# Altium footprint library SMPSProject.PcbLib: 143 footprints (part 9 of 9)
Each footprint in its own frame and in the unit in brackets; x right, y up, seen from the top. Pads: shape width x height; smd on the part's side, far side on the other; paste and mask are expansions set on the pad; w line width, h text height; cw(c..) or ccw(c..) is an arc to the next point about the centre after c.
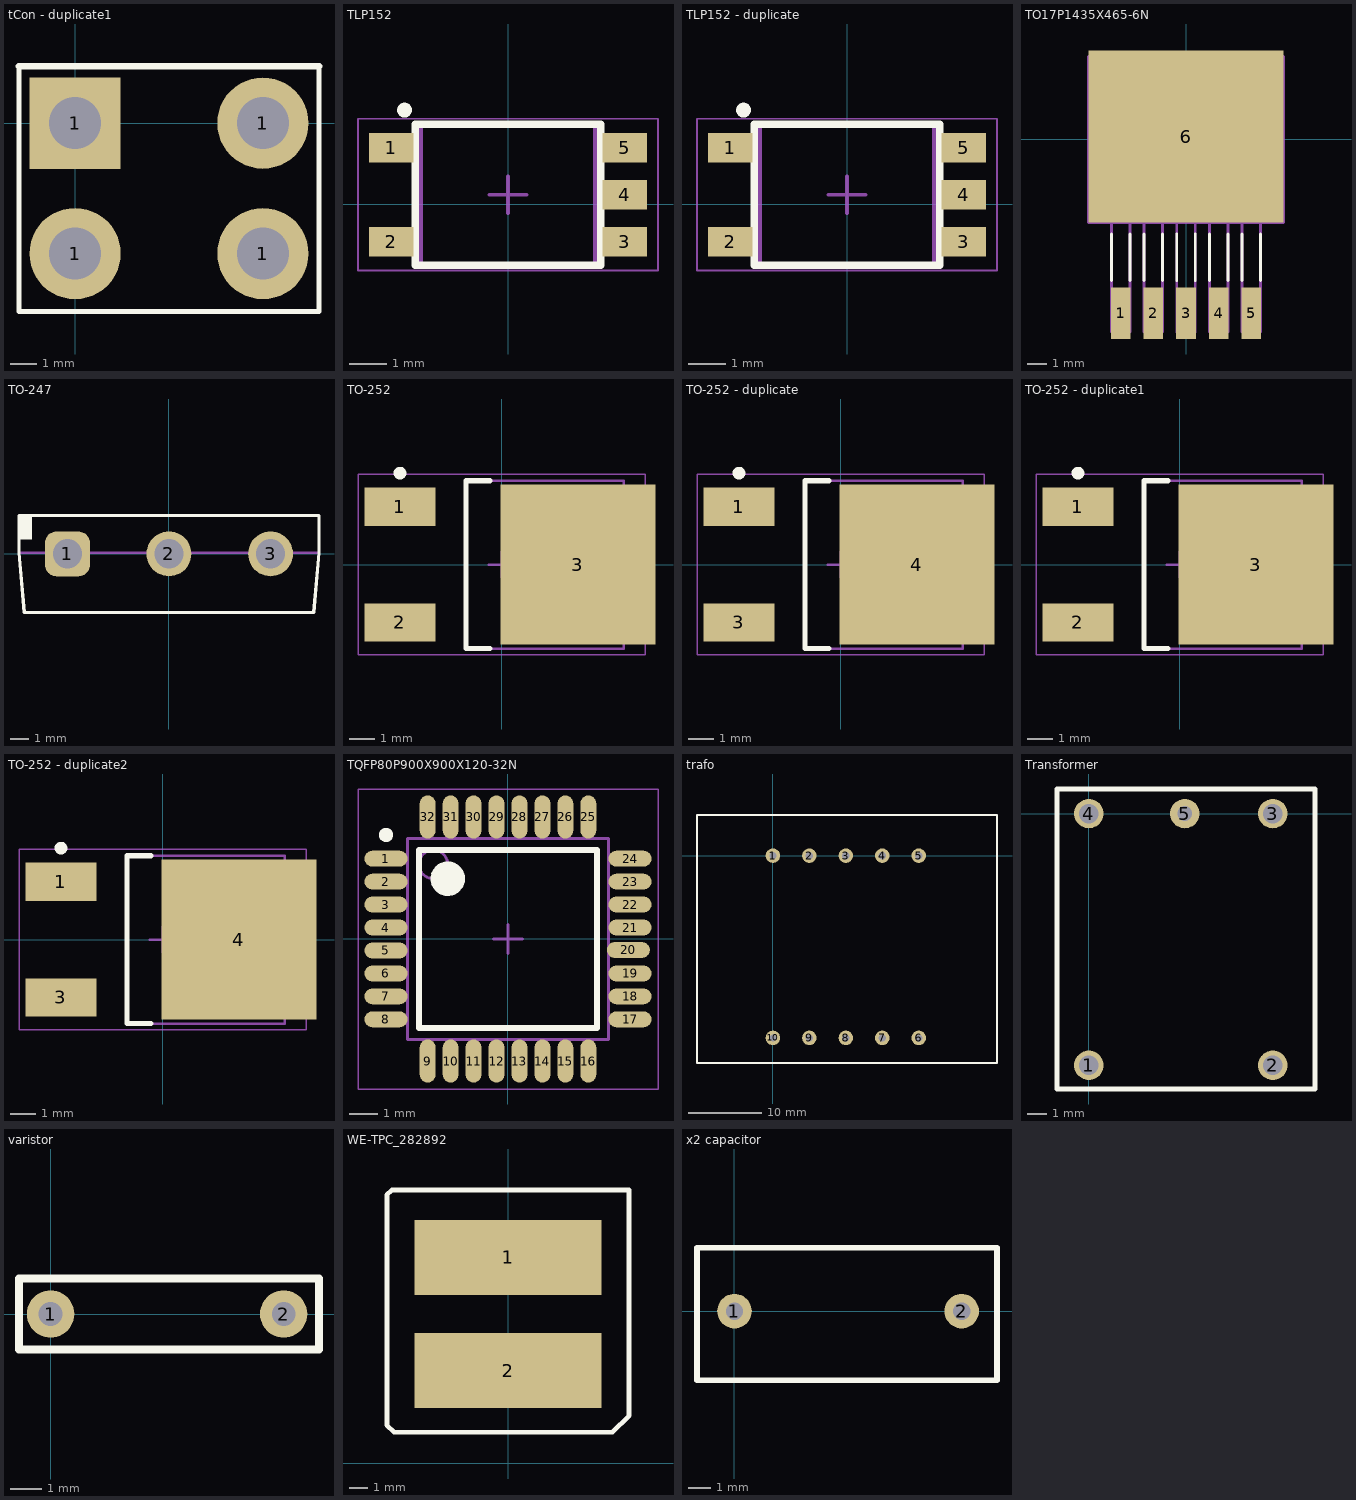
[diagram p8: the footprints below, top view; thin cyan lines are the x and y axes]

## tCon - duplicate1 [mm]
pads (4):
  round 3.5 hole 2: 1(0,-5) 1(7.2,-5) 1(7.2,0)
  rect 3.5x3.5 hole 2: 1(0,0)
Top Overlay:
  lines w0.2: -2.15,2.175 -2.15,-7.225 -0.05,-7.225 5.75,-7.225 7.925,-7.225 9.35,-7.225 9.35,2.175
  lines w0.254: -2.15,2.175 9.35,2.175

## TLP152 [mm] "SOTFL, 5-Leads, Body 3.75x7.20mm, Pitch 1.27mm, IPC Medium Density"
height 2.2
pads (5):
  rect 1.2x0.8 smd: 1(-3.15,1.524) 2(-3.15,-1.016) 3(3.15,-1.016) 4(3.15,0.254) 5(3.15,1.524)
Top Overlay:
  lines w0.2: -2.5,-1.646 -2.5,2.154 2.5,2.154 2.5,-1.646 -2.5,-1.646
  lines w0.25: -2.72,2.538 cw(c-2.794,2.54) -2.72,2.547
Top Courtyard:
  lines w0.05: -4.05,-1.796 4.05,-1.796 4.05,2.304 -4.05,2.304 -4.05,-1.796
  lines w0.1: -0.5,0.254 0.5,0.254 ; 0,-0.246 0,0.754
Top Assembly:
  lines w0.1: -2.35,-1.646 2.35,-1.646 2.35,2.154 -2.35,2.154 -2.35,-1.646
3D body "User Library-TLP-152-1.STEP": height 2.11, standoff 0.01, extent -3.393,-1.651 3.383,2.149

## TLP152 - duplicate [mm] "SOTFL, 5-Leads, Body 3.75x7.20mm, Pitch 1.27mm, IPC Medium Density"
height 2.2
pads (5):
  rect 1.2x0.8 smd: 1(-3.15,1.524) 2(-3.15,-1.016) 3(3.15,-1.016) 4(3.15,0.254) 5(3.15,1.524)
Top Overlay:
  lines w0.2: -2.5,-1.646 -2.5,2.154 2.5,2.154 2.5,-1.646 -2.5,-1.646
  lines w0.25: -2.72,2.538 cw(c-2.794,2.54) -2.72,2.547
Top Courtyard:
  lines w0.05: -4.05,-1.796 4.05,-1.796 4.05,2.304 -4.05,2.304 -4.05,-1.796
  lines w0.1: -0.5,0.254 0.5,0.254 ; 0,-0.246 0,0.754
Top Assembly:
  lines w0.1: -2.35,-1.646 2.35,-1.646 2.35,2.154 -2.35,2.154 -2.35,-1.646
3D body "User Library-TLP-152-1.STEP": height 2.11, standoff 0.01, extent -3.393,-1.651 3.383,2.149

## TO17P1435X465-6N [mil]
pads (6):
  rect 40x106 smd: 1(-134,-356) 2(-67,-356) 3(0,-356) 4(67,-356) 5(134,-356)
  rect 400x352 smd: 6(0,6)
Top Overlay:
  lines w6: -153,-289 -153,-194 ; -115,-289 -115,-194 ; -86,-289 -86,-194 ; -48,-289 -48,-194 ; -19,-289 -19,-194 ; 19,-289 19,-194 ; 48,-289 48,-194 ; 86,-289 86,-194 ; 115,-289 115,-194 ; 153,-289 153,-194
Mechanical 13:
  lines w6: -200,-170 -200,170 200,170 200,-170 -200,-170 ; -153,-395 -115,-395 -115,-170 -153,-170 -153,-395 ; -86,-395 -48,-395 -48,-170 -86,-170 -86,-395 ; -19,-395 19,-395 19,-170 -19,-170 -19,-395 ; 48,-395 86,-395 86,-170 48,-170 48,-395 ; 115,-395 153,-395 153,-170 115,-170 115,-395
3D body "LM2596SX-12--3DModel-STEP-56544.STEP": height 183.5, standoff -5.5, extent -200.98,-391.77 199.02,173.23

## TO-247 [mil] "Standard TO-247"
height 1000
pads (3):
  rrect50% 95x95 / inner round 78 / far side rrect50% 95x95 hole 62: 1(-215,0)
  round 95 / inner round 78 / far side round 95 hole 62: 2(0,0) 3(215,0)
Top Overlay:
  rectangle: -317.51,30 -290,81.11
  lines w7: -317.51,2.37 -306.45,-124.01 306.47,-124.01 317.53,2.37 317.53,81.11 -317.51,81.11 -317.51,2.37
Mechanical 5:
  lines w5: -317.51,2.37 -317.51,81.11 317.53,81.11 317.53,2.37 ; -317.51,2.37 -306.45,-124.01 306.47,-124.01 317.53,2.37 ; -317.51,2.37 317.53,2.37
  text ".Designator" at -78.74,-78.74 h30
3D body "User Library-PG-TO247-3-21.STEP": height 995.38, standoff -623.91, extent -316.93,-122.05 309.06,78.74

## TO-252 [mm]
height 2.4
pads (3):
  rect 2.8x1.5 smd: 1(-4,2.275) 2(-4,-2.275)
  rect 6.1x6.3 smd: 3(3,0)
Top Overlay:
  circle w0.25: c-4,3.6 r0.125
  lines w0.2: -0.45,-3.3 -1.4,-3.3 -1.4,3.3 -0.45,3.3
Top Courtyard:
  lines w0.05: -5.65,-3.55 -5.65,3.55 5.65,3.55 5.65,-3.55 -5.65,-3.55
  lines w0.1: -0.5,0 0.5,0 ; 0,-0.5 0,0.5
Top Assembly:
  lines w0.1: -1.4,-3.3 -1.4,3.3 4.8,3.3 4.8,-3.3 -1.4,-3.3
3D body "User Library-DPAK_TO-252AA.step": height 2.41, standoff 0.01, extent -4.523,-3.367 5.577,3.367

## TO-252 - duplicate [mm]
height 2.4
pads (3):
  rect 2.8x1.5 smd: 1(-4,2.275) 3(-4,-2.275)
  rect 6.1x6.3 smd: 4(3,0)
Top Overlay:
  circle w0.25: c-4,3.6 r0.125
  lines w0.2: -0.45,-3.3 -1.4,-3.3 -1.4,3.3 -0.45,3.3
Top Courtyard:
  lines w0.05: -5.65,-3.55 5.65,-3.55 5.65,3.55 -5.65,3.55 -5.65,-3.55
  lines w0.1: -0.5,0 0.5,0 ; 0,-0.5 0,0.5
Top Assembly:
  lines w0.1: -1.4,-3.3 4.8,-3.3 4.8,3.3 -1.4,3.3 -1.4,-3.3
3D body "User Library-DPAK_TO-252AA.step": height 2.41, standoff 0.01, extent -4.523,-3.367 5.577,3.367

## TO-252 - duplicate1 [mm]
height 2.4
pads (3):
  rect 2.8x1.5 smd: 1(-4,2.275) 2(-4,-2.275)
  rect 6.1x6.3 smd: 3(3,0)
Top Overlay:
  circle w0.25: c-4,3.6 r0.125
  lines w0.2: -0.45,-3.3 -1.4,-3.3 -1.4,3.3 -0.45,3.3
Top Courtyard:
  lines w0.05: -5.65,-3.55 5.65,-3.55 5.65,3.55 -5.65,3.55 -5.65,-3.55
  lines w0.1: -0.5,0 0.5,0 ; 0,-0.5 0,0.5
Top Assembly:
  lines w0.1: -1.4,-3.3 4.8,-3.3 4.8,3.3 -1.4,3.3 -1.4,-3.3
3D body "User Library-DPAK_TO-252AA.step": height 2.41, standoff 0.01, extent -4.523,-3.367 5.577,3.367

## TO-252 - duplicate2 [mm]
height 2.4
pads (3):
  rect 2.8x1.5 smd: 1(-4,2.275) 3(-4,-2.275)
  rect 6.1x6.3 smd: 4(3,0)
Top Overlay:
  circle w0.25: c-4,3.6 r0.125
  lines w0.2: -0.45,-3.3 -1.4,-3.3 -1.4,3.3 -0.45,3.3
Top Courtyard:
  lines w0.05: -5.65,-3.55 -5.65,3.55 5.65,3.55 5.65,-3.55 -5.65,-3.55
  lines w0.1: -0.5,0 0.5,0 ; 0,-0.5 0,0.5
Top Assembly:
  lines w0.1: -1.4,-3.3 -1.4,3.3 4.8,3.3 4.8,-3.3 -1.4,-3.3
3D body "User Library-DPAK_TO-252AA.step": height 2.41, standoff 0.01, extent -4.523,-3.367 5.577,3.367

## TQFP80P900X900X120-32N [mm] "TQFP, 32-Leads, Body 7.00x7.00mm, Pitch 0.80mm, IPC Medium Density"
height 1.2
pads (32):
  oval 1.5x0.55 smd: 1(-4.25,2.8) 2(-4.25,2) 3(-4.25,1.2) 4(-4.25,0.4) 5(-4.25,-0.4) 6(-4.25,-1.2) 7(-4.25,-2) 8(-4.25,-2.8) 17(4.25,-2.8) 18(4.25,-2) 19(4.25,-1.2) 20(4.191,-0.381) 21(4.25,0.4) 22(4.25,1.2) 23(4.25,2) 24(4.25,2.8)
  oval 0.55x1.5 smd: 9(-2.8,-4.25) 10(-2,-4.25) 11(-1.2,-4.25) 12(-0.4,-4.25) 13(0.4,-4.25) 14(1.2,-4.25) 15(2,-4.25) 16(2.8,-4.25) 25(2.8,4.25) 26(2,4.25) 27(1.2,4.25) 28(0.4,4.25) 29(-0.4,4.25) 30(-1.2,4.25) 31(-2,4.25) 32(-2.8,4.25)
Top Overlay:
  circle w0.6: c-2.1,2.1 r0.3
  circle w0.25: c-4.25,3.625 r0.125
  lines w0.2: -3.1,-3.1 3.1,-3.1 3.1,3.1 -3.1,3.1 -3.1,-3.1
Mechanical 13:
  circle w0.1: c-2.6,2.6 r0.5
  lines w0.1: -3.5,-3.5 3.5,-3.5 3.5,3.5 -3.5,3.5 -3.5,-3.5
Mechanical 15:
  lines w0.05: -5.225,-5.225 5.225,-5.225 5.225,5.225 -5.225,5.225 -5.225,-5.225
  lines w0.1: -0.5,0 0.5,0 ; 0,-0.5 0,0.5
3D body "User Library-QFP32.STEP": height 1.6, standoff -0.05, extent -4.445,-4.5 4.555,4.5

## trafo [mm]
pads (10):
  round 2 hole 1: 1(0,0) 2(5,0) 3(10,0) 4(15,0) 5(20,0) 6(20,-25) 7(15,-25) 8(10,-25) 9(5,-25) 10(0,-25)
Top Overlay:
  lines w0.254: -10.414,-28.448 -10.414,5.588 -4.826,5.588 30.734,5.588 30.734,-28.448 -10.414,-28.448

## Transformer [mil]
pads (5):
  round 60 hole 39.37: 1(0,-511.81) 2(374.02,-511.81) 3(374.02,0) 4(0,0)
  round 60 hole 30: 5(195,0)
Top Overlay:
  lines w10: -65,-560 -65,50 460,50 460,-560 -65,-560

## varistor [mil]
pads (2):
  round 60 hole 30: 1(0,0) 2(295.28,0)
Top Overlay:
  lines w10: -40,-45 340,-45 340,45 -40,45 -40,25 -40,-45
3D body "Disk Varistor D7,5mm P5mm W4,5mm.stp": height 423.23, standoff -125.98, extent 10,-70 304.68,81.63

## WE-TPC_282892 [mm]
pads (2):
  rect 10x4 smd: 1(0,11) 2(0,4.953)
Top Overlay:
  lines w0.254: -6.477,2.032 -6.096,1.651 5.588,1.651 6.477,2.54 6.477,13.843 6.477,14.605 -6.223,14.605 -6.477,14.351 -6.477,2.032
3D body "Inductor SMD 7850.stp": height 4.91, standoff -0.04, extent -4.333,4.061 2.667,11.687

## x2 capacitor [mil]
pads (2):
  round 60 hole 30: 1(0,0) 2(393.7,0)
Top Overlay:
  lines w10: -65,-120 -65,110 455,110 455,-120 -65,-120
3D body "User Library-WIMA-MKP-X2.STEP": height 440.94, standoff -196.85, extent -60.91,-154.96 450.91,160